# Altium footprint library CONN_HDR_1.27MM_ST.PcbLib: 116 footprints (part 4 of 9)
Each footprint in its own frame and in the unit in brackets; x right, y up, seen from the top. Pads: shape width x height; smd on the part's side, far side on the other; paste and mask are expansions set on the pad; w line width, h text height; cw(c..) or ccw(c..) is an arc to the next point about the centre after c.
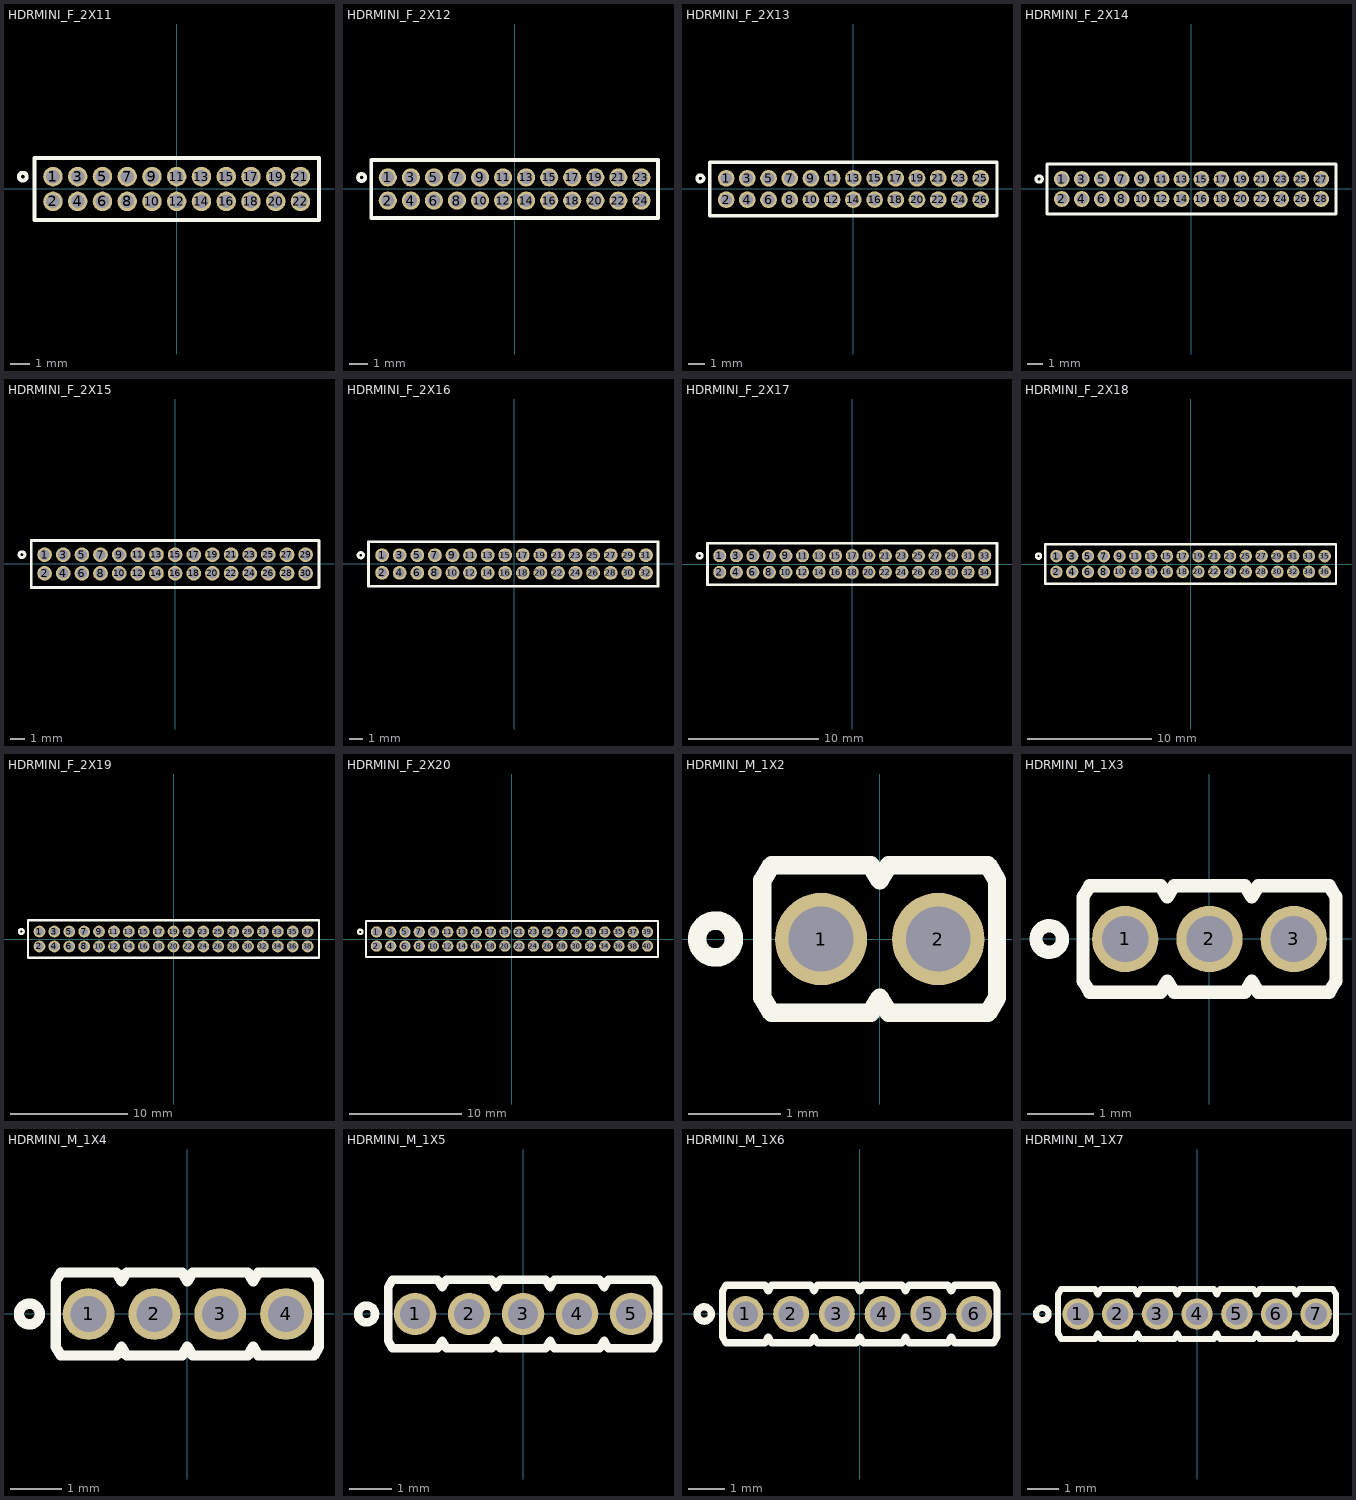
[diagram p3: the footprints below, top view; thin cyan lines are the x and y axes]

## HDRMINI_F_2X11 [mm] "mini header (50mil pitch)"
pads (22):
  round 1 hole 0.7 mask+0.05: 1(-6.35,0.635) 2(-6.35,-0.635) 3(-5.08,0.635) 4(-5.08,-0.635) 5(-3.81,0.635) 6(-3.81,-0.635) 7(-2.54,0.635) 8(-2.54,-0.635) 9(-1.27,0.635) 10(-1.27,-0.635) 11(0,0.635) 12(0,-0.635) 13(1.27,0.635) 14(1.27,-0.635) 15(2.54,0.635) 16(2.54,-0.635) 17(3.81,0.635) 18(3.81,-0.635) 19(5.08,0.635) 20(5.08,-0.635) 21(6.35,0.635) 22(6.35,-0.635)
Top Overlay:
  circle w0.2: c-7.893,0.635 r0.2
  lines w0.2: -7.3,-1.6 7.3,-1.6 7.3,1.6 -7.3,1.6 -7.3,-1.6
3D body "female_header_a-bl127-eg-g11d.stp": height 3.45, standoff -2.35, extent -7.185,-1.535 7.185,0.265
3D body "female_header_a-bl127-eg-g11d.stp": height 3.45, standoff -2.35, extent -7.185,-0.265 7.185,1.535

## HDRMINI_F_2X12 [mm] "mini header (50mil pitch)"
pads (24):
  round 1 hole 0.7 mask+0.05: 1(-6.985,0.635) 2(-6.985,-0.635) 3(-5.715,0.635) 4(-5.715,-0.635) 5(-4.445,0.635) 6(-4.445,-0.635) 7(-3.175,0.635) 8(-3.175,-0.635) 9(-1.905,0.635) 10(-1.905,-0.635) 11(-0.635,0.635) 12(-0.635,-0.635) 13(0.635,0.635) 14(0.635,-0.635) 15(1.905,0.635) 16(1.905,-0.635) 17(3.175,0.635) 18(3.175,-0.635) 19(4.445,0.635) 20(4.445,-0.635) 21(5.715,0.635) 22(5.715,-0.635) 23(6.985,0.635) 24(6.985,-0.635)
Top Overlay:
  circle w0.2: c-8.428,0.635 r0.2
  lines w0.2: -7.9,-1.6 -7.9,1.6 7.9,1.6 7.9,-1.6 -7.9,-1.6
3D body "female_header_a-bl127-eg-g12d.stp": height 3.45, standoff -2.35, extent -7.82,-0.265 7.82,1.535
3D body "female_header_a-bl127-eg-g12d.stp": height 3.45, standoff -2.35, extent -7.82,-1.535 7.82,0.265

## HDRMINI_F_2X13 [mm] "mini header (50mil pitch)"
pads (26):
  round 1 hole 0.7 mask+0.05: 1(-7.62,0.635) 2(-7.62,-0.635) 3(-6.35,0.635) 4(-6.35,-0.635) 5(-5.08,0.635) 6(-5.08,-0.635) 7(-3.81,0.635) 8(-3.81,-0.635) 9(-2.54,0.635) 10(-2.54,-0.635) 11(-1.27,0.635) 12(-1.27,-0.635) 13(0,0.635) 14(0,-0.635) 15(1.27,0.635) 16(1.27,-0.635) 17(2.54,0.635) 18(2.54,-0.635) 19(3.81,0.635) 20(3.81,-0.635) 21(5.08,0.635) 22(5.08,-0.635) 23(6.35,0.635) 24(6.35,-0.635) 25(7.62,0.635) 26(7.62,-0.635)
Top Overlay:
  circle w0.2: c-9.163,0.635 r0.2
  lines w0.2: -8.6,-1.6 8.6,-1.6 8.6,1.6 -8.6,1.6 -8.6,-1.6
3D body "female_header_a-bl127-eg-g13d.stp": height 3.45, standoff -2.35, extent -8.455,-1.535 8.455,0.265
3D body "female_header_a-bl127-eg-g13d.stp": height 3.45, standoff -2.35, extent -8.455,-0.265 8.455,1.535

## HDRMINI_F_2X14 [mm] "mini header (50mil pitch)"
pads (28):
  round 1 hole 0.7 mask+0.05: 1(-8.255,0.635) 2(-8.255,-0.635) 3(-6.985,0.635) 4(-6.985,-0.635) 5(-5.715,0.635) 6(-5.715,-0.635) 7(-4.445,0.635) 8(-4.445,-0.635) 9(-3.175,0.635) 10(-3.175,-0.635) 11(-1.905,0.635) 12(-1.905,-0.635) 13(-0.635,0.635) 14(-0.635,-0.635) 15(0.635,0.635) 16(0.635,-0.635) 17(1.905,0.635) 18(1.905,-0.635) 19(3.175,0.635) 20(3.175,-0.635) 21(4.445,0.635) 22(4.445,-0.635) 23(5.715,0.635) 24(5.715,-0.635) 25(6.985,0.635) 26(6.985,-0.635) 27(8.255,0.635) 28(8.255,-0.635)
Top Overlay:
  circle w0.2: c-9.698,0.635 r0.2
  lines w0.2: -9.2,-1.6 9.2,-1.6 9.2,1.6 -9.2,1.6 -9.2,-1.6
3D body "female_header_a-bl127-eg-g14d.stp": height 3.45, standoff -2.35, extent -9.09,-1.535 9.09,0.265
3D body "female_header_a-bl127-eg-g14d.stp": height 3.45, standoff -2.35, extent -9.09,-0.265 9.09,1.535

## HDRMINI_F_2X15 [mm] "mini header (50mil pitch)"
pads (30):
  round 1 hole 0.7 mask+0.05: 1(-8.89,0.635) 2(-8.89,-0.635) 3(-7.62,0.635) 4(-7.62,-0.635) 5(-6.35,0.635) 6(-6.35,-0.635) 7(-5.08,0.635) 8(-5.08,-0.635) 9(-3.81,0.635) 10(-3.81,-0.635) 11(-2.54,0.635) 12(-2.54,-0.635) 13(-1.27,0.635) 14(-1.27,-0.635) 15(0,0.635) 16(0,-0.635) 17(1.27,0.635) 18(1.27,-0.635) 19(2.54,0.635) 20(2.54,-0.635) 21(3.81,0.635) 22(3.81,-0.635) 23(5.08,0.635) 24(5.08,-0.635) 25(6.35,0.635) 26(6.35,-0.635) 27(7.62,0.635) 28(7.62,-0.635) 29(8.89,0.635) 30(8.89,-0.635)
Top Overlay:
  circle w0.2: c-10.433,0.635 r0.2
  lines w0.2: -9.8,-1.6 -9.8,1.6 9.8,1.6 9.8,-1.6 -9.8,-1.6
3D body "female_header_a-bl127-eg-g15d.stp": height 3.45, standoff -2.35, extent -9.725,-0.265 9.725,1.535
3D body "female_header_a-bl127-eg-g15d.stp": height 3.45, standoff -2.35, extent -9.725,-1.535 9.725,0.265

## HDRMINI_F_2X16 [mm] "mini header (50mil pitch)"
pads (32):
  round 1 hole 0.7 mask+0.05: 1(-9.525,0.635) 2(-9.525,-0.635) 3(-8.255,0.635) 4(-8.255,-0.635) 5(-6.985,0.635) 6(-6.985,-0.635) 7(-5.715,0.635) 8(-5.715,-0.635) 9(-4.445,0.635) 10(-4.445,-0.635) 11(-3.175,0.635) 12(-3.175,-0.635) 13(-1.905,0.635) 14(-1.905,-0.635) 15(-0.635,0.635) 16(-0.635,-0.635) 17(0.635,0.635) 18(0.635,-0.635) 19(1.905,0.635) 20(1.905,-0.635) 21(3.175,0.635) 22(3.175,-0.635) 23(4.445,0.635) 24(4.445,-0.635) 25(5.715,0.635) 26(5.715,-0.635) 27(6.985,0.635) 28(6.985,-0.635) 29(8.255,0.635) 30(8.255,-0.635) 31(9.525,0.635) 32(9.525,-0.635)
Top Overlay:
  circle w0.2: c-11.068,0.635 r0.2
  lines w0.2: -10.5,-1.6 10.4,-1.6 10.4,1.6 -10.5,1.6 -10.5,-1.6
3D body "female_header_a-bl127-eg-g16d.stp": height 3.45, standoff -2.35, extent -10.36,-0.265 10.36,1.535
3D body "female_header_a-bl127-eg-g16d.stp": height 3.45, standoff -2.35, extent -10.36,-1.535 10.36,0.265

## HDRMINI_F_2X17 [mm] "mini header (50mil pitch)"
pads (34):
  round 1 hole 0.7 mask+0.05: 1(-10.16,0.635) 2(-10.16,-0.635) 3(-8.89,0.635) 4(-8.89,-0.635) 5(-7.62,0.635) 6(-7.62,-0.635) 7(-6.35,0.635) 8(-6.35,-0.635) 9(-5.08,0.635) 10(-5.08,-0.635) 11(-3.81,0.635) 12(-3.81,-0.635) 13(-2.54,0.635) 14(-2.54,-0.635) 15(-1.27,0.635) 16(-1.27,-0.635) 17(0,0.635) 18(0,-0.635) 19(1.27,0.635) 20(1.27,-0.635) 21(2.54,0.635) 22(2.54,-0.635) 23(3.81,0.635) 24(3.81,-0.635) 25(5.08,0.635) 26(5.08,-0.635) 27(6.35,0.635) 28(6.35,-0.635) 29(7.62,0.635) 30(7.62,-0.635) 31(8.89,0.635) 32(8.89,-0.635) 33(10.16,0.635) 34(10.16,-0.635)
Top Overlay:
  circle w0.2: c-11.703,0.635 r0.2
  lines w0.2: -11.1,-1.6 -11.1,1.6 11.1,1.6 11.1,-1.6 -11.1,-1.6
3D body "female_header_a-bl127-eg-g17d.stp": height 3.45, standoff -2.35, extent -10.995,-0.265 10.995,1.535
3D body "female_header_a-bl127-eg-g17d.stp": height 3.45, standoff -2.35, extent -10.995,-1.535 10.995,0.265

## HDRMINI_F_2X18 [mm] "mini header (50mil pitch)"
pads (36):
  round 1 hole 0.7 mask+0.05: 1(-10.795,0.635) 2(-10.795,-0.635) 3(-9.525,0.635) 4(-9.525,-0.635) 5(-8.255,0.635) 6(-8.255,-0.635) 7(-6.985,0.635) 8(-6.985,-0.635) 9(-5.715,0.635) 10(-5.715,-0.635) 11(-4.445,0.635) 12(-4.445,-0.635) 13(-3.175,0.635) 14(-3.175,-0.635) 15(-1.905,0.635) 16(-1.905,-0.635) 17(-0.635,0.635) 18(-0.635,-0.635) 19(0.635,0.635) 20(0.635,-0.635) 21(1.905,0.635) 22(1.905,-0.635) 23(3.175,0.635) 24(3.175,-0.635) 25(4.445,0.635) 26(4.445,-0.635) 27(5.715,0.635) 28(5.715,-0.635) 29(6.985,0.635) 30(6.985,-0.635) 31(8.255,0.635) 32(8.255,-0.635) 33(9.525,0.635) 34(9.525,-0.635) 35(10.795,0.635) 36(10.795,-0.635)
Top Overlay:
  circle w0.2: c-12.238,0.635 r0.2
  lines w0.2: -11.7,-1.6 -11.7,1.6 11.7,1.6 11.7,-1.6 -11.7,-1.6
3D body "female_header_a-bl127-eg-g18d.stp": height 3.45, standoff -2.35, extent -11.63,-0.265 11.63,1.535
3D body "female_header_a-bl127-eg-g18d.stp": height 3.45, standoff -2.35, extent -11.63,-1.535 11.63,0.265

## HDRMINI_F_2X19 [mm] "mini header (50mil pitch)"
pads (38):
  round 1 hole 0.7 mask+0.05: 1(-11.43,0.635) 2(-11.43,-0.635) 3(-10.16,0.635) 4(-10.16,-0.635) 5(-8.89,0.635) 6(-8.89,-0.635) 7(-7.62,0.635) 8(-7.62,-0.635) 9(-6.35,0.635) 10(-6.35,-0.635) 11(-5.08,0.635) 12(-5.08,-0.635) 13(-3.81,0.635) 14(-3.81,-0.635) 15(-2.54,0.635) 16(-2.54,-0.635) 17(-1.27,0.635) 18(-1.27,-0.635) 19(0,0.635) 20(0,-0.635) 21(1.27,0.635) 22(1.27,-0.635) 23(2.54,0.635) 24(2.54,-0.635) 25(3.81,0.635) 26(3.81,-0.635) 27(5.08,0.635) 28(5.08,-0.635) 29(6.35,0.635) 30(6.35,-0.635) 31(7.62,0.635) 32(7.62,-0.635) 33(8.89,0.635) 34(8.89,-0.635) 35(10.16,0.635) 36(10.16,-0.635) 37(11.43,0.635) 38(11.43,-0.635)
Top Overlay:
  circle w0.2: c-12.973,0.635 r0.2
  lines w0.2: -12.4,-1.6 12.4,-1.6 12.4,1.6 -12.4,1.6 -12.4,-1.6
3D body "female_header_a-bl127-eg-g19d.stp": height 3.45, standoff -2.35, extent -12.265,-1.535 12.265,0.265
3D body "female_header_a-bl127-eg-g19d.stp": height 3.45, standoff -2.35, extent -12.265,-0.265 12.265,1.535

## HDRMINI_F_2X20 [mm] "mini header (50mil pitch)"
pads (40):
  round 1 hole 0.7 mask+0.05: 1(-12.065,0.635) 2(-12.065,-0.635) 3(-10.795,0.635) 4(-10.795,-0.635) 5(-9.525,0.635) 6(-9.525,-0.635) 7(-8.255,0.635) 8(-8.255,-0.635) 9(-6.985,0.635) 10(-6.985,-0.635) 11(-5.715,0.635) 12(-5.715,-0.635) 13(-4.445,0.635) 14(-4.445,-0.635) 15(-3.175,0.635) 16(-3.175,-0.635) 17(-1.905,0.635) 18(-1.905,-0.635) 19(-0.635,0.635) 20(-0.635,-0.635) 21(0.635,0.635) 22(0.635,-0.635) 23(1.905,0.635) 24(1.905,-0.635) 25(3.175,0.635) 26(3.175,-0.635) 27(4.445,0.635) 28(4.445,-0.635) 29(5.715,0.635) 30(5.715,-0.635) 31(6.985,0.635) 32(6.985,-0.635) 33(8.255,0.635) 34(8.255,-0.635) 35(9.525,0.635) 36(9.525,-0.635) 37(10.795,0.635) 38(10.795,-0.635) 39(12.065,0.635) 40(12.065,-0.635)
Top Overlay:
  circle w0.2: c-13.508,0.635 r0.2
  lines w0.2: -13,-1.6 13,-1.6 13,1.6 -13,1.6 -13,-1.6
3D body "female_header_a-bl127-eg-g20d.stp": height 3.45, standoff -2.35, extent -12.9,-0.265 12.9,1.535
3D body "female_header_a-bl127-eg-g20d.stp": height 3.45, standoff -2.35, extent -12.9,-1.535 12.9,0.265

## HDRMINI_M_1X2 [mm] "mini header (50mil pitch)"
pads (2):
  round 1 / inner round 1 / far side oval 1x1.4 hole 0.7 mask+0.05: 1(-0.635,0) 2(0.635,0)
Top Overlay:
  circle w0.2: c-1.778,0 r0.2
  lines w0.2: -1.27,-0.635 -1.171,-0.8 -0.099,-0.8 0,-0.635 0.099,-0.8 1.171,-0.8 1.27,-0.635 1.27,0.635 1.171,0.8 0.099,0.8 0,0.635 -0.099,0.8 -1.171,0.8 -1.27,0.635 -1.27,-0.635
3D body: height 7.3, standoff -2.5, extent -0.835,-0.2 -0.435,0.2
3D body: height 2.8, standoff 0, extent -1.27,-0.635 0,0.635
3D body: height 2.8, standoff 0, extent 0,-0.635 1.27,0.635
3D body: height 7.3, standoff -2.5, extent 0.435,-0.2 0.835,0.2

## HDRMINI_M_1X3 [mm] "mini header (50mil pitch)"
pads (3):
  round 1 / inner round 1 / far side oval 1x1.4 hole 0.7 mask+0.05: 1(-1.27,0) 2(0,0) 3(1.27,0)
Top Overlay:
  circle w0.2: c-2.413,0 r0.2
  lines w0.2: -1.905,-0.635 -1.806,-0.8 -0.734,-0.8 -0.635,-0.635 -0.536,-0.8 0.536,-0.8 0.635,-0.635 0.734,-0.8 1.806,-0.8 1.905,-0.635 1.905,0.635 1.806,0.8 0.734,0.8 0.635,0.635 0.536,0.8 -0.536,0.8 -0.635,0.635 -0.734,0.8 -1.806,0.8 -1.905,0.635 -1.905,-0.635
3D body: height 7.3, standoff -2.5, extent 1.07,-0.2 1.47,0.2
3D body: height 2.8, standoff 0, extent 0.635,-0.635 1.905,0.635
3D body: height 7.3, standoff -2.5, extent -0.2,-0.2 0.2,0.2
3D body: height 2.8, standoff 0, extent -0.635,-0.635 0.635,0.635
3D body: height 7.3, standoff -2.5, extent -1.47,-0.2 -1.07,0.2
3D body: height 2.8, standoff 0, extent -1.905,-0.635 -0.635,0.635

## HDRMINI_M_1X4 [mm] "mini header (50mil pitch)"
pads (4):
  round 1 / inner round 1 / far side oval 1x1.4 hole 0.7 mask+0.05: 1(-1.905,0) 2(-0.635,0) 3(0.635,0) 4(1.905,0)
Top Overlay:
  circle w0.2: c-3.048,0 r0.2
  lines w0.2: -2.54,-0.635 -2.441,-0.8 -1.369,-0.8 -1.27,-0.635 -1.171,-0.8 -0.099,-0.8 0,-0.635 0.099,-0.8 1.171,-0.8 1.27,-0.635 1.369,-0.8 2.441,-0.8 2.54,-0.635 2.54,0.635 2.441,0.8 1.369,0.8 1.27,0.635 1.171,0.8 0.099,0.8 0,0.635 -0.099,0.8 -1.171,0.8 -1.27,0.635 -1.369,0.8 -2.441,0.8 -2.54,0.635 -2.54,-0.635
3D body: height 7.3, standoff -2.5, extent -0.835,-0.2 -0.435,0.2
3D body: height 2.8, standoff 0, extent -1.27,-0.635 0,0.635
3D body: height 7.3, standoff -2.5, extent 0.435,-0.2 0.835,0.2
3D body: height 2.8, standoff 0, extent 0,-0.635 1.27,0.635
3D body: height 7.3, standoff -2.5, extent 1.705,-0.2 2.105,0.2
3D body: height 2.8, standoff 0, extent 1.27,-0.635 2.54,0.635
3D body: height 7.3, standoff -2.5, extent -2.105,-0.2 -1.705,0.2
3D body: height 2.8, standoff 0, extent -2.54,-0.635 -1.27,0.635

## HDRMINI_M_1X5 [mm] "mini header (50mil pitch)"
pads (5):
  round 1 / inner round 1 / far side oval 1x1.4 hole 0.7 mask+0.05: 1(-2.54,0) 2(-1.27,0) 3(0,0) 4(1.27,0) 5(2.54,0)
Top Overlay:
  circle w0.2: c-3.683,0 r0.2
  lines w0.2: -3.175,-0.635 -3.076,-0.8 -2.004,-0.8 -1.905,-0.635 -1.806,-0.8 -0.734,-0.8 -0.635,-0.635 -0.536,-0.8 0.536,-0.8 0.635,-0.635 0.734,-0.8 1.806,-0.8 1.905,-0.635 2.004,-0.8 3.076,-0.8 3.175,-0.635 3.175,0.635 3.076,0.8 2.004,0.8 1.905,0.635 1.806,0.8 0.734,0.8 0.635,0.635 0.536,0.8 -0.536,0.8 -0.635,0.635 -0.734,0.8 -1.806,0.8 -1.905,0.635 -2.004,0.8 -3.076,0.8 -3.175,0.635 -3.175,-0.635
3D body: height 7.3, standoff -2.5, extent -1.47,-0.2 -1.07,0.2
3D body: height 2.8, standoff 0, extent -1.905,-0.635 -0.635,0.635
3D body: height 7.3, standoff -2.5, extent -0.2,-0.2 0.2,0.2
3D body: height 2.8, standoff 0, extent -0.635,-0.635 0.635,0.635
3D body: height 7.3, standoff -2.5, extent 1.07,-0.2 1.47,0.2
3D body: height 2.8, standoff 0, extent 0.635,-0.635 1.905,0.635
3D body: height 7.3, standoff -2.5, extent 2.34,-0.2 2.74,0.2
3D body: height 2.8, standoff 0, extent 1.905,-0.635 3.175,0.635
3D body: height 7.3, standoff -2.5, extent -2.74,-0.2 -2.34,0.2
3D body: height 2.8, standoff 0, extent -3.175,-0.635 -1.905,0.635

## HDRMINI_M_1X6 [mm] "mini header (50mil pitch)"
pads (6):
  round 1 / inner round 1 / far side oval 1x1.4 hole 0.7 mask+0.05: 1(-3.175,0) 2(-1.905,0) 3(-0.635,0) 4(0.635,0) 5(1.905,0) 6(3.175,0)
Top Overlay:
  circle w0.2: c-4.318,0 r0.2
  lines w0.2: -3.81,-0.635 -3.711,-0.8 -2.639,-0.8 -2.54,-0.635 -2.441,-0.8 -1.369,-0.8 -1.27,-0.635 -1.171,-0.8 -0.099,-0.8 0,-0.635 0.099,-0.8 1.171,-0.8 1.27,-0.635 1.369,-0.8 2.441,-0.8 2.54,-0.635 2.639,-0.8 3.711,-0.8 3.81,-0.635 3.81,0.635 3.711,0.8 2.639,0.8 2.54,0.635 2.441,0.8 1.369,0.8 1.27,0.635 1.171,0.8 0.099,0.8 0,0.635 -0.099,0.8 -1.171,0.8 -1.27,0.635 -1.369,0.8 -2.441,0.8 -2.54,0.635 -2.639,0.8 -3.711,0.8 -3.81,0.635 -3.81,-0.635
3D body: height 2.8, standoff 0, extent -2.54,-0.635 -1.27,0.635
3D body: height 7.3, standoff -2.5, extent -2.105,-0.2 -1.705,0.2
3D body: height 2.8, standoff 0, extent -1.27,-0.635 0,0.635
3D body: height 7.3, standoff -2.5, extent -0.835,-0.2 -0.435,0.2
3D body: height 2.8, standoff 0, extent 0,-0.635 1.27,0.635
3D body: height 7.3, standoff -2.5, extent 0.435,-0.2 0.835,0.2
3D body: height 2.8, standoff 0, extent 1.27,-0.635 2.54,0.635
3D body: height 7.3, standoff -2.5, extent 1.705,-0.2 2.105,0.2
3D body: height 2.8, standoff 0, extent 2.54,-0.635 3.81,0.635
3D body: height 7.3, standoff -2.5, extent 2.975,-0.2 3.375,0.2
3D body: height 7.3, standoff -2.5, extent -3.375,-0.2 -2.975,0.2
3D body: height 2.8, standoff 0, extent -3.81,-0.635 -2.54,0.635

## HDRMINI_M_1X7 [mm] "mini header (50mil pitch)"
pads (7):
  round 1 / inner round 1 / far side oval 1x1.4 hole 0.7 mask+0.05: 1(-3.81,0) 2(-2.54,0) 3(-1.27,0) 4(0,0) 5(1.27,0) 6(2.54,0) 7(3.81,0)
Top Overlay:
  circle w0.2: c-4.953,0 r0.2
  lines w0.2: -4.445,-0.635 -4.346,-0.8 -3.274,-0.8 -3.175,-0.635 -3.076,-0.8 -2.004,-0.8 -1.905,-0.635 -1.806,-0.8 -0.734,-0.8 -0.635,-0.635 -0.536,-0.8 0.536,-0.8 0.635,-0.635 0.734,-0.8 1.806,-0.8 1.905,-0.635 2.004,-0.8 3.076,-0.8 3.175,-0.635 3.274,-0.8 4.346,-0.8 4.445,-0.635 4.445,0.635 4.346,0.8 3.274,0.8 3.175,0.635 3.076,0.8 2.004,0.8 1.905,0.635 1.806,0.8 0.734,0.8 0.635,0.635 0.536,0.8 -0.536,0.8 -0.635,0.635 -0.734,0.8 -1.806,0.8 -1.905,0.635 -2.004,0.8 -3.076,0.8 -3.175,0.635 -3.274,0.8 -4.346,0.8 -4.445,0.635 -4.445,-0.635
3D body: height 2.8, standoff 0, extent -3.175,-0.635 -1.905,0.635
3D body: height 7.3, standoff -2.5, extent -2.74,-0.2 -2.34,0.2
3D body: height 2.8, standoff 0, extent -1.905,-0.635 -0.635,0.635
3D body: height 7.3, standoff -2.5, extent -1.47,-0.2 -1.07,0.2
3D body: height 2.8, standoff 0, extent -0.635,-0.635 0.635,0.635
3D body: height 7.3, standoff -2.5, extent -0.2,-0.2 0.2,0.2
3D body: height 2.8, standoff 0, extent 0.635,-0.635 1.905,0.635
3D body: height 7.3, standoff -2.5, extent 1.07,-0.2 1.47,0.2
3D body: height 2.8, standoff 0, extent 1.905,-0.635 3.175,0.635
3D body: height 7.3, standoff -2.5, extent 2.34,-0.2 2.74,0.2
3D body: height 7.3, standoff -2.5, extent 3.61,-0.2 4.01,0.2
3D body: height 2.8, standoff 0, extent 3.175,-0.635 4.445,0.635
3D body: height 7.3, standoff -2.5, extent -4.01,-0.2 -3.61,0.2
3D body: height 2.8, standoff 0, extent -4.445,-0.635 -3.175,0.635